# Altium footprint library my_PcbLib.PcbLib: 58 footprints (part 2 of 4)
Each footprint in its own frame and in the unit in brackets; x right, y up, seen from the top. Pads: shape width x height; smd on the part's side, far side on the other; paste and mask are expansions set on the pad; w line width, h text height; cw(c..) or ccw(c..) is an arc to the next point about the centre after c.
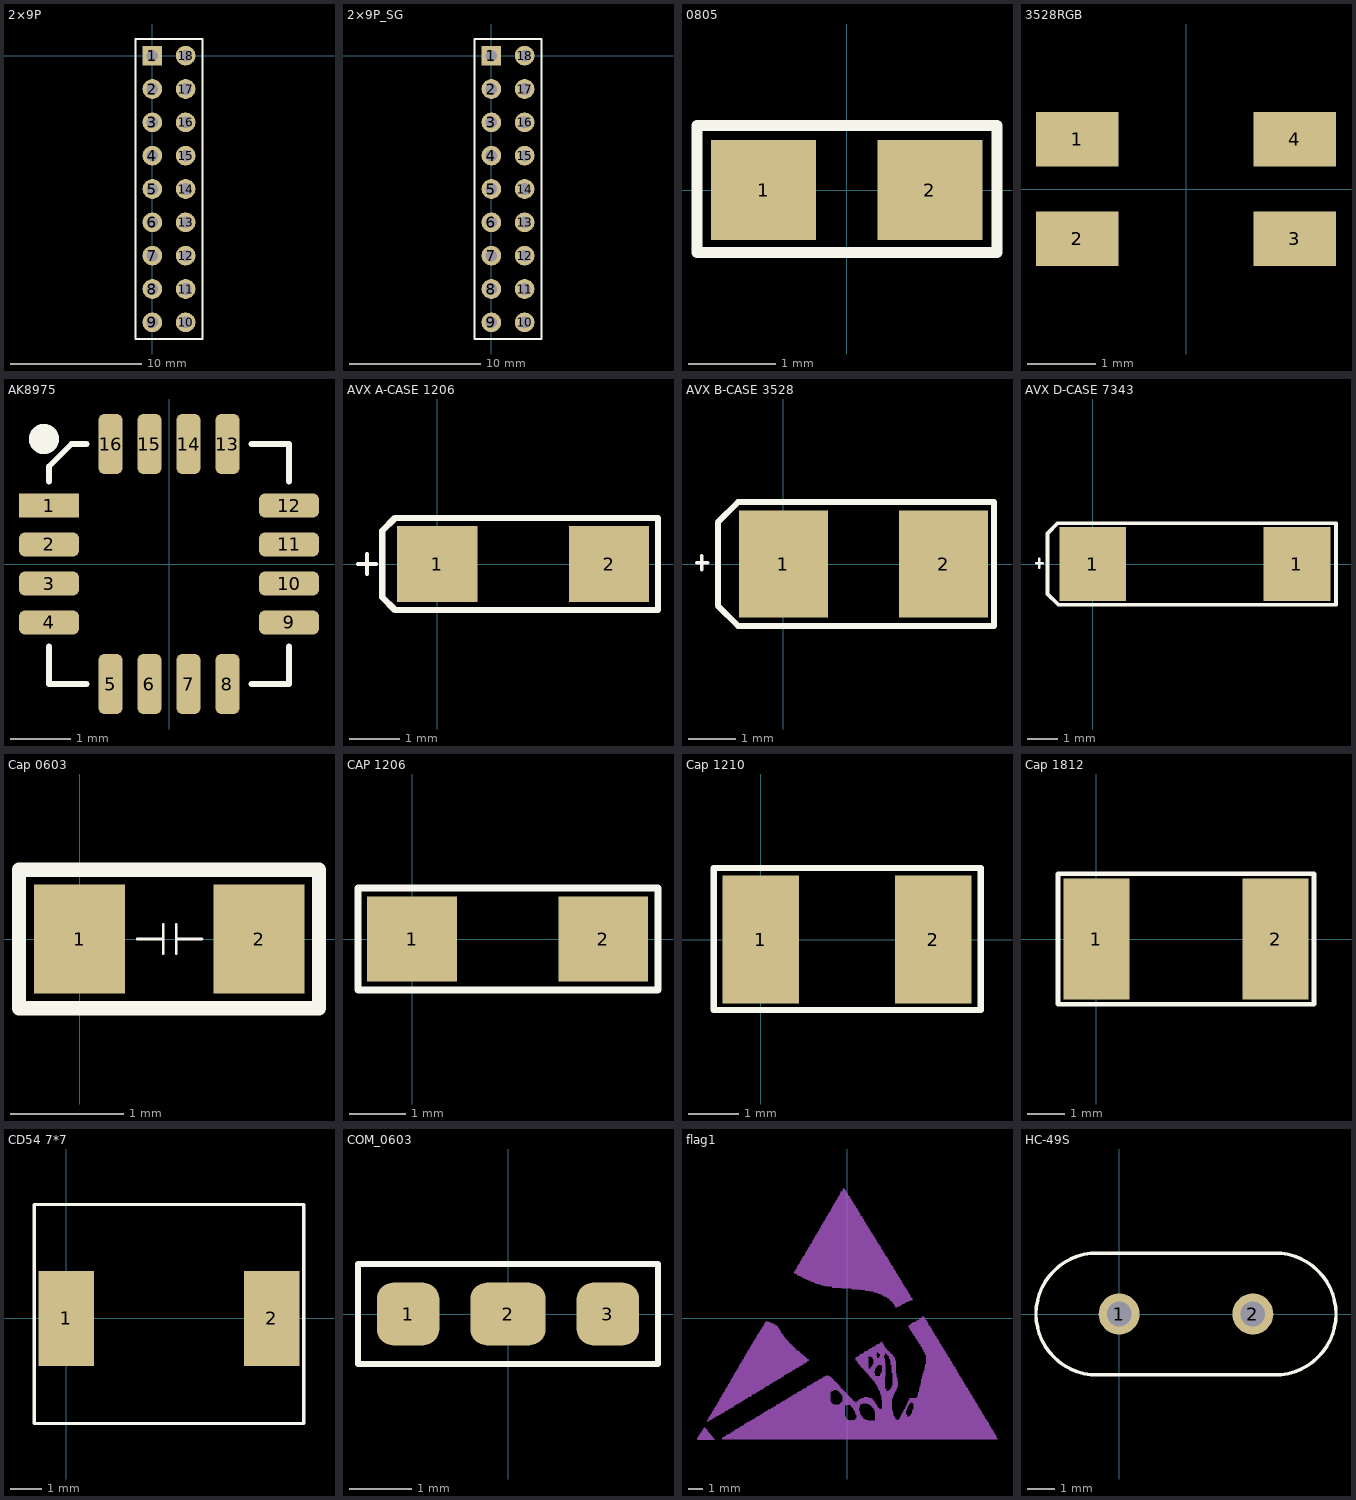
[diagram p1: the footprints below, top view; thin cyan lines are the x and y axes]

## 2×9P [mm]
pads (18):
  rect 1.5x1.5 hole 0.9: 1(0,0)
  round 1.5 hole 0.9: 2(0,-2.54) 3(0,-5.08) 4(0,-7.62) 5(0,-10.16) 6(0,-12.7) 7(0,-15.24) 8(0,-17.78) 9(0,-20.32) 10(2.54,-20.32) 11(2.54,-17.78) 12(2.54,-15.24) 13(2.54,-12.7) 14(2.54,-10.16) 15(2.54,-7.62) 16(2.54,-5.08) 17(2.54,-2.54) 18(2.54,0)
Top Overlay:
  lines w0.152: -1.27,-21.59 -1.27,1.27 3.81,1.27 3.81,-21.59 -1.27,-21.59
3D body "User Library-PLD-xxPLD-8.STEP": height 8.4, standoff -3, extent -1.23,-8.89 3.77,1.27
3D body "User Library-PLD-xxPLD-6.STEP": height 8.4, standoff -3, extent -1.23,-16.51 3.77,-8.89
3D body "User Library-PLD-xxPLD-4.STEP": height 8.4, standoff -3, extent -1.23,-21.59 3.77,-16.51

## 2×9P_SG [mm]
pads (18):
  rect 1.5x1.5 hole 0.9: 1(0,0)
  round 1.5 hole 0.9: 2(0,-2.54) 3(0,-5.08) 4(0,-7.62) 5(0,-10.16) 6(0,-12.7) 7(0,-15.24) 8(0,-17.78) 9(0,-20.32) 10(2.54,-20.32) 11(2.54,-17.78) 12(2.54,-15.24) 13(2.54,-12.7) 14(2.54,-10.16) 15(2.54,-7.62) 16(2.54,-5.08) 17(2.54,-2.54) 18(2.54,0)
Top Overlay:
  lines w0.152: -1.27,-21.59 3.81,-21.59 3.81,1.27 -1.27,1.27 -1.27,-21.59
3D body "User Library-ZL262-4SG.STEP": height 8.4, standoff -3.15, extent 1.27,-21.59 3.77,-11.43
3D body "User Library-ZL262-4SG.STEP": height 8.4, standoff -3.15, extent -1.23,-21.59 1.27,-11.43
3D body "User Library-ZL262-5SG.STEP": height 8.4, standoff -3.15, extent 1.27,-11.43 3.77,1.27
3D body "User Library-ZL262-5SG.STEP": height 8.4, standoff -3.15, extent -1.23,-11.43 1.27,1.27

## 0805 [mm]
pads (2):
  rect 1.2x1.14 smd: 1(-0.95,0) 2(0.95,0)
Top Overlay:
  lines w0.127: -1.712,-0.711 -1.712,0.737 1.717,0.737 1.717,-0.711 -1.712,-0.711
3D body "User Library-CAPC2013X10.STEP": height 1, standoff 0, extent -1.01,-0.625 0.99,0.625

## 3528RGB [mm]
pads (4):
  rect 1.2x0.8 smd: 1(-1.587,0.725) 2(-1.587,-0.725) 3(1.587,-0.725) 4(1.587,0.725)
3D body "User Library-KAA-3528.STEP": height 1.9, standoff 0, extent -1.737,-1.412 1.763,1.388

## AK8975 [mm]
pads (16):
  rect 1x0.4 smd: 1(-2,0.975)
  rrect50% 1x0.4 smd: 2(-2,0.325) 3(-2,-0.325) 4(-2,-0.975) 9(2,-0.975) 10(2,-0.325) 11(2,0.325) 12(2,0.975)
  rrect50% 0.4x1 smd: 5(-0.975,-2) 6(-0.325,-2) 7(0.325,-2) 8(0.975,-2) 13(0.975,2) 14(0.325,2) 15(-0.325,2) 16(-0.975,2)
Top Overlay:
  circle w0.254: c-2.083,2.083 r0.125
  lines w0.1: -2,-1.375 -2,-2 -1.375,-2 ; -2,1.375 -2,1.625 -1.625,2 -1.375,2 ; 1.375,-2 2,-2 2,-1.375 ; 1.375,2 2,2 2,1.375
3D body "QFN16_4x4.STEP": height 0.92, standoff 0, extent -2,-2 2,2

## AVX A-CASE 1206 [mm]
pads (2):
  rect 1.6x1.52 smd: 1(0,0) 2(3.42,0)
Top Overlay:
  lines w0.076: -1.575,0 -1.219,0 ; -1.397,-0.203 -1.397,0.203
  lines w0.127: -1.092,-0.66 -1.092,0.66 -0.838,0.914 4.394,0.914 4.394,-0.914 -0.838,-0.914 -1.092,-0.66
3D body "User Library-AVX_ACASE.STEP": height 1.71, standoff 0, extent 0.002,-0.84 3.402,0.84

## AVX B-CASE 3528 [mm]
pads (2):
  rect 1.9x2.28 smd: 1(0,0) 2(3.42,0)
Top Overlay:
  lines w0.076: -1.841,0.025 -1.613,0.025 ; -1.74,-0.127 -1.74,0.178
  lines w0.127: -1.397,-0.889 -1.397,0.889 -0.965,1.321 4.496,1.321 4.496,-1.321 -0.965,-1.321 -1.397,-0.889
3D body "AVX-B_3528.STEP": height 2.03, standoff 0, extent -0.148,-1.465 3.552,1.465

## AVX D-CASE 7343 [mm]
pads (2):
  rect 2.16x2.41 smd: 1(0,0) 1(6.61,0)
Top Overlay:
  lines w0.076: -1.841,0.025 -1.613,0.025 ; -1.74,-0.127 -1.74,0.178
  lines w0.127: -1.473,-0.965 -1.473,0.991 -1.143,1.321 7.874,1.321 7.874,-1.321 -1.118,-1.321 -1.473,-0.965
3D body "User Library-AVX_D_CASE.STEP": height 3.01, standoff 0, extent -0.398,-2.225 7.002,2.225

## Cap 0603 [mm]
pads (2):
  rect 0.8x0.96 smd: 1(0,0) 2(1.58,0)
Top Overlay:
  lines w0.025: 0.508,0 0.737,0 ; 0.737,-0.127 0.737,0.127 ; 0.851,-0.127 0.851,0.127 ; 0.851,0 1.079,0
  lines w0.127: -0.533,-0.61 2.108,-0.61 2.108,0.61 -0.533,0.61 -0.533,-0.61
3D body "User Library-CAPC1608X09.STEP": height 0.9, standoff 0, extent -0.013,-0.4 1.588,0.4

## CAP 1206 [mm]
pads (2):
  rect 1.6x1.52 smd: 1(0,0) 2(3.42,0)
Top Overlay:
  lines w0.127: -0.965,-0.914 4.394,-0.914 4.394,0.914 -0.965,0.914 -0.965,-0.914
3D body "User Library-Vhip cap 1206.STEP": height 1.72, standoff -0.02, extent 0.102,-0.85 3.302,0.85

## Cap 1210 [mm]
pads (2):
  rect 1.52x2.54 smd: 1(0,0) 2(3.42,0)
Top Overlay:
  lines w0.127: -0.94,-1.397 -0.94,1.422 4.369,1.422 4.369,-1.397 -0.94,-1.397
3D body "User Library-CAPC3225X13.STEP": height 1.3, standoff 0, extent 0.102,-1.25 3.302,1.25

## Cap 1812 [mm]
pads (2):
  rect 1.75x3.2 smd: 1(0,0) 2(4.75,0)
Top Overlay:
  lines w0.127: -1.016,-1.727 -1.016,1.727 5.766,1.727 5.766,-1.727 -1.016,-1.727
3D body "User Library-cap_1812.STEP": height 2.6, standoff 0, extent 0.088,-1.6 4.688,1.6

## CD54 7*7 [mm]
pads (2):
  rect 1.75x3 smd: 1(0,0) 2(6.5,0)
Top Overlay:
  lines w0.102: -1.016,-3.327 7.518,-3.327 7.518,3.607 -1.016,3.607 -1.016,-3.327
3D body "User Library-CD54.STEP": height 4.5, standoff 0, extent 0.293,-2.609 6.209,2.591

## COM_0603 [mm]
pads (3):
  rrect50% 1x1 smd: 1(-1.6,0) 3(1.6,0)
  rrect50% 1.2x1 smd: 2(0,0)
Top Overlay:
  lines w0.1: -2.4,-0.8 2.4,-0.8 2.4,0.8 -2.4,0.8 -2.4,-0.8 ; -2.4,0.4 -2.4,0.4 ; -2.4,0.5 -2.4,0.5
3D body "User Library-RESC1608X05N.STEP": height 0.45, standoff 0, extent -1.575,-0.425 -0.025,0.425

## flag1 [mm]
Bottom Overlay:
  drawing of 2422 lines, arcs and shapes, not listed

## HC-49S [mm]
pads (2):
  round 1.5 hole 0.9: 1(0,0) 2(4.9,0)
Top Overlay:
  lines w0.127: -0.787,-2.235 cw(c-0.813,0) -0.787,2.235 5.687,2.235 cw(c5.713,0) 5.687,-2.235 -0.787,-2.235
3D body "User Library-HC49S-1.STEP": height 3.6, standoff -3, extent -3.05,-2.245 7.93,2.246